# Altium footprint library standard.PcbLib: 330 footprints (part 19 of 21)
Each footprint in its own frame and in the unit in brackets; x right, y up, seen from the top. Pads: shape width x height; smd on the part's side, far side on the other; paste and mask are expansions set on the pad; w line width, h text height; cw(c..) or ccw(c..) is an arc to the next point about the centre after c.
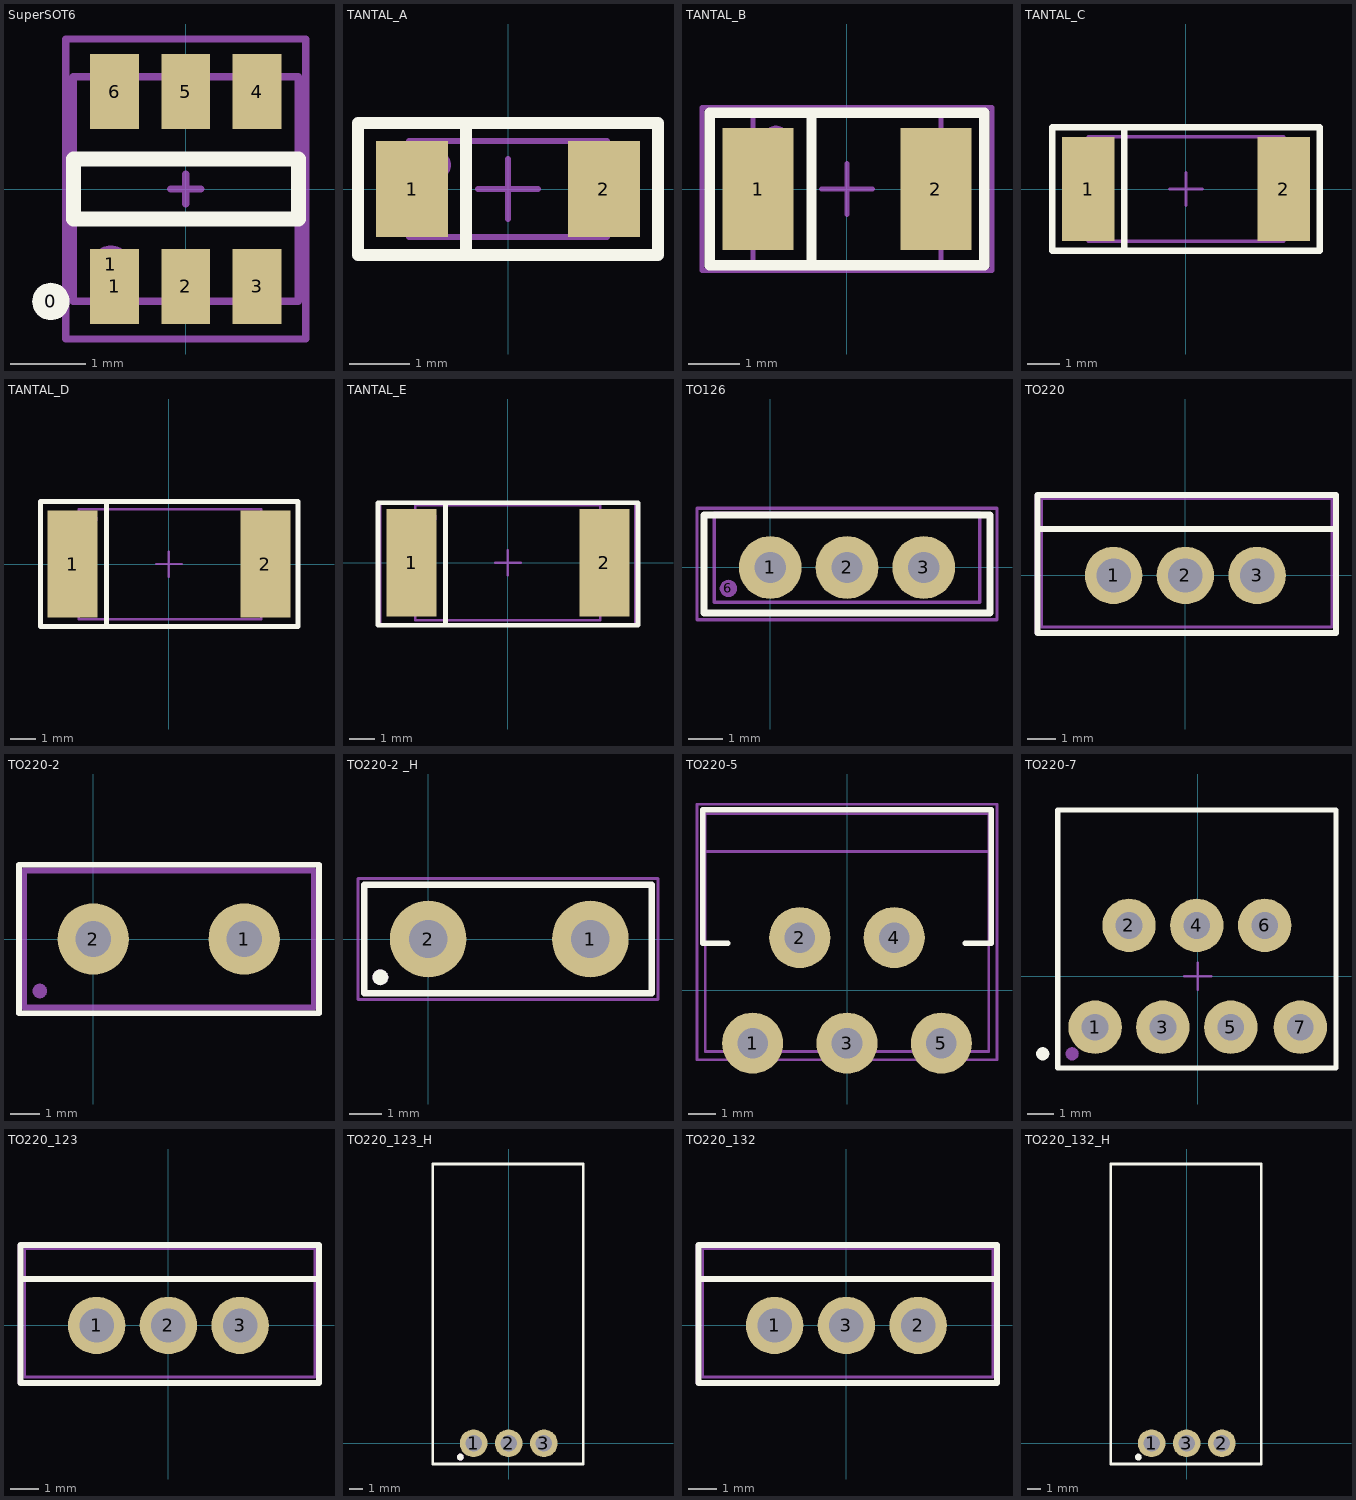
[diagram p18: the footprints below, top view; thin cyan lines are the x and y axes]

## SuperSOT6 [mm]
pads (8):
  round 0.5 on Top Overlay: 0(-1.8,-1.5)
  round 0.5 on Mech1: 1(-1,-1)
  rect 0.65x1 smd: 1(-0.95,-1.3) 2(0,-1.3) 3(0.95,-1.3) 4(0.95,1.3) 5(0,1.3) 6(-0.95,1.3)
Top Overlay:
  lines w0.2: -1.5,-0.4 1.5,-0.4 1.5,0.4 -1.5,0.4 -1.5,-0.4
Mechanical 1:
  lines w0.1: -1.5,-1.5 -1.5,1.5 1.5,1.5 1.5,-1.5 -1.5,-1.5
Mechanical 15:
  lines w0.1: -0.2,0 0.2,0 ; 0,-0.2 0,0.2 ; -1.6,-2 1.6,-2 1.6,2 1.5,2 -1.6,2 -1.6,-2
3D body "User Library-SSOT-6.STEP": height 1.05, standoff 0, extent -1.5,-1.5 1.5,1.5

## TANTAL_A [mm]
height 1.6
pads (3):
  rect 1.2x1.6 smd: 1(-1.6,0) 2(1.6,0)
  round 0.5 on Mech1: ""(-1.2,0.4)
Top Overlay:
  lines w0.2: -0.7,-1.1 -0.7,1.1 ; -2.5,-1.1 2.5,-1.1 2.5,1.1 -2.5,1.1 -2.5,-1.1
Mechanical 1:
  lines w0.1: -1.651,-0.8 1.651,-0.8 1.651,0.8 -1.651,0.8 -1.651,-0.8
Mechanical 15:
  lines w0.1: -0.5,0 0.5,0 ; 0,-0.5 0,0.5 ; -2.5,-1.1 -2.5,1.1 2.5,1.1 2.5,-1.1 -2.5,-1.1
3D body "User Library-AVX_ACASE.STEP": height 1.71, standoff 0, extent -1.7,-0.84 1.7,0.84

## TANTAL_B [mm]
height 1.9
pads (3):
  rect 1.4x2.4 smd: 1(-1.75,0) 2(1.75,0)
  round 0.5 on Mech1: ""(-1.4,1)
Top Overlay:
  lines w0.2: -0.7,-1.5 -0.7,1.5 ; -2.7,-1.5 2.7,-1.5 2.7,1.5 -2.7,1.5 -2.7,-1.5
Mechanical 1:
  lines w0.1: -1.85,-1.465 -1.85,1.465 1.85,1.465 1.85,-1.465 -1.85,-1.465
Mechanical 15:
  lines w0.1: -0.5,0 0.5,0 ; 0,-0.5 0,0.5 ; -2.85,-1.6 -2.85,1.6 2.85,1.6 2.85,-1.6 -2.85,-1.6
3D body "User Library-AVX_BCASE.STEP": height 2.03, standoff 0, extent -1.85,-1.465 1.85,1.465

## TANTAL_C [mm]
height 2.5
pads (3):
  rect 1.6x3.2 smd: 1(-3,0) 2(3,0)
  round 0.5 on Mech1: ""(-2.5,1.1)
Top Overlay:
  lines w0.2: -1.9,-1.9 -1.9,1.9 ; -4.1,-1.9 4.1,-1.9 4.1,1.9 -4.1,1.9 -4.1,-1.9
Mechanical 1:
  lines w0.1: -3,-1.6 -3,1.6 3,1.6 3,-1.6 -3,-1.6
Mechanical 15:
  lines w0.1: -0.5,0 0.5,0 ; 0,-0.5 0,0.5 ; -4.1,-1.9 -4.1,1.9 4.1,1.9 4.1,-1.9 -4.1,-1.9
3D body "User Library-AVX_C_CASE.STEP": height 2.7, standoff 0, extent -3.05,-1.675 3.05,1.675

## TANTAL_D [mm]
height 2.9
pads (3):
  rect 2x4.3 smd: 1(-3.85,0) 2(3.85,0)
  round 0.5 on Mech1: ""(-3.1,1.8)
Top Overlay:
  lines w0.2: -2.5,-2.5 -2.5,2.5 ; -5.15,-2.5 -5.15,2.5 5.15,2.5 5.15,-2.5 -5.15,-2.5
Mechanical 1:
  lines w0.1: -3.6,-2.2 3.7,-2.2 3.7,2.2 -3.6,2.2 -3.6,-2.2
Mechanical 15:
  lines w0.1: -0.5,0 0.5,0 ; 0,-0.5 0,0.5 ; -5.15,-2.5 5.15,-2.5 5.15,2.5 -5.15,2.5 -5.15,-2.5
3D body "User Library-AVX_D_CASE.STEP": height 3.01, standoff 0, extent -3.7,-2.225 3.7,2.225

## TANTAL_E [mm]
height 2.9
pads (3):
  rect 2x4.3 smd: 1(-3.85,0) 2(3.85,0)
  round 0.5 on Mech1: ""(-3.1,1.8)
Top Overlay:
  lines w0.2: -2.5,-2.5 -2.5,2.4 ; -5.2,-2.5 -5.2,2.4 5.2,2.4 5.2,-2.5 -5.2,-2.5
Mechanical 1:
  lines w0.1: -3.7,-2.3 3.7,-2.3 3.7,2.3 -3.7,2.3 -3.7,-2.3
Mechanical 15:
  lines w0.1: -0.5,0 0.5,0 ; 0,-0.5 0,0.5 ; -5.1,-2.5 5.1,-2.5 5.1,2.4 -5.1,2.4 -5.1,-2.5
3D body "User Library-AVX_E_CASE.STEP": height 4.2, standoff 0, extent -3.7,-2.225 3.7,2.225

## TO126 [mm]
pads (4):
  round 1.8 hole 0.9: 1(0,0) 2(2.2,0) 3(4.4,0)
  round 0.5 on Mech1: 6(-1.2,-0.6)
Top Overlay:
  lines w0.2: -1.9,-1.3 6.3,-1.3 6.3,1.5 -1.9,1.5 -1.9,-1.3
Mechanical 1:
  lines w0.1: -1.6,-1 -1.6,1.55 6,1.55 6,-1 -1.6,-1
Mechanical 15:
  lines w0.1: -2.1,-1.5 6.5,-1.5 6.5,1.7 -2.1,1.7 -2.1,-1.5
3D body "User Library-TO-126 (SOT32) Gold PCB.STEP": height 13.19, standoff -3.54, extent -1.6,-1 6,1.55

## TO220 [mm] "Generic TO-220 case, stay variant"
height 22
pads (3):
  round 2 hole 1.2: 1(-2.5,0) 2(0,0) 3(2.5,0)
Top Overlay:
  lines w0.2: -5.15,1.619 5.247,1.619 ; -5.15,-2 5.247,-2 5.247,2.8 -5.15,2.8 -5.15,-2
Mechanical 1:
  lines w0.1: -5,1.6 5.1,1.6 ; -5,-1.8 -5,2.675 5.1,2.675 5.1,-1.8 -5,-1.8
Mechanical 15:
  lines w0.1: -0.5,0 0.5,0 ; 0,-0.5 0,0.5 ; -5.2,-2 5.247,-2 5.247,2.8 -5.2,2.8 -5.2,-2
3D body "User Library-TO-220-4.STEP": height 22.06, standoff -6.74, extent -5,-1.8 5.2,2.7

## TO220-2 [mm]
pads (3):
  round 2.4 hole 1.2: 1(5.08,0) 2(0,0)
  round 0.5 on Mech1: ""(-1.8,-1.75)
Top Overlay:
  lines w0.2: -2.5,-2.5 7.6,-2.5 7.6,2.5 -2.5,2.5 -2.5,-2.5
Mechanical 1:
  lines w0.1: -2.276,-2.25 7.376,-2.25 7.376,2.25 -2.276,2.25 -2.276,-2.25
Mechanical 15:
  lines w0.1: -2.35,-2.35 7.45,-2.35 7.45,2.35 -2.35,2.35 -2.35,-2.35
3D body "User Library-TO 220-2.STEP": height 20.3, standoff -8.08, extent -2.276,-2.25 7.376,2.25

## TO220-2 _H [mm]
pads (4):
  round 2.4 hole 1.2: 1(5.08,0) 2(0,0)
  round 0.5 on Mech1: ""(-1.5,-1.2)
  round 0.5 on Top Overlay: ""(-1.5,-1.2)
Top Overlay:
  lines w0.2: -2,-1.7 -2,1.7 7,1.7 7,-1.7 -2,-1.7
Mechanical 1:
  lines w0.1: -2,-1.7 -2,1.7 7,1.7 7,-1.7 -2,-1.7
Mechanical 15:
  lines w0.1: -2.2,-1.9 -2.2,1.9 7.2,1.9 7.2,-1.9 -2.2,-1.9
3D body "User Library-TO220-2_OR-INV.STEP": height 0.72, standoff -7.5, extent -2.45,-0.4 7.55,20.2

## TO220-5 [mm] "5-Lead Plastic TO-220"
height 20
pads (5):
  round 2.2 hole 1.1: 1(-3.4,-1.9) 2(-1.7,1.9) 3(0,-1.9) 4(1.7,1.9) 5(3.4,-1.9)
Top Overlay:
  lines w0.2: -4.3,1.7 -5.2,1.7 -5.2,6.5 5.2,6.5 5.2,1.7 4.25,1.7
Mechanical 1:
  lines w0.1: -5.1,5 5.1,5 ; -5.1,-2.2 -5.1,6.356 5.1,6.356 5.1,-2.2 -5.1,-2.2
Mechanical 15:
  lines w0.1: -5.4,-2.5 -5.4,6.7 5.4,6.7 5.4,-2.5 -5.4,-2.5
3D body "TO220-5.step": height 19, standoff -9.28, extent -5.1,-2.2 5.1,6.356

## TO220-7 [mm]
height 20
pads (9):
  round 2 hole 1: 1(-3.84,-1.905) 2(-2.57,1.905) 3(-1.3,-1.905) 4(-0.03,1.905) 5(1.24,-1.905) 6(2.51,1.905) 7(3.84,-1.905)
  round 0.5 on Top Overlay: ""(-5.8,-2.9)
  round 0.5 on Mech1: ""(-4.7,-2.9)
Top Overlay:
  lines w0.2: -5.237,-3.429 5.177,-3.429 5.177,6.223 -5.237,6.223 -5.237,-3.429
Mechanical 1:
  lines w0.1: -5.237,-3.429 5.177,-3.429 5.177,6.223 -5.237,6.223 -5.237,-3.429
Mechanical 15:
  lines w0.05: -5.237,-3.429 -5.237,6.223 5.177,6.223 5.177,-3.429 -5.237,-3.429
  lines w0.1: -0.5,0 0.5,0 ; 0,-0.5 0,0.5
3D body "R-PZFM-T7.STEP": height 21, standoff -3.35, extent -5.04,-2.205 4.96,6.045

## TO220_123 [mm] "Generic TO-220 case, stay variant"
height 22
pads (3):
  round 2 hole 1.2: 1(-2.5,0) 2(0,0) 3(2.5,0)
Top Overlay:
  lines w0.2: -5.15,1.619 5.247,1.619 ; -5.15,-2 5.247,-2 5.247,2.8 -5.15,2.8 -5.15,-2
Mechanical 1:
  lines w0.1: -5,1.6 5.1,1.6 ; -5,-1.8 -5,2.675 5.1,2.675 5.1,-1.8 -5,-1.8
Mechanical 15:
  lines w0.1: -0.5,0 0.5,0 ; 0,-0.5 0,0.5 ; -5.2,-2 5.247,-2 5.247,2.8 -5.2,2.8 -5.2,-2
3D body "User Library-TO-220-4.STEP": height 22.06, standoff -6.74, extent -5,-1.8 5.2,2.7

## TO220_123_H [mm] "Generic TO-220 case, stay variant"
height 22
pads (5):
  round 2 hole 1.2: 1(-2.54,0) 2(0,0) 3(2.54,0)
  round 0.5 on Mech1: ""(-3.5,-1)
  round 0.5 on Top Overlay: ""(-3.5,-1)
Top Overlay:
  lines w0.2: -5.5,-1.5 5.4,-1.5 5.4,20.2 -5.5,20.2 -5.5,-1.5
Mechanical 15:
  lines w0.1: -0.5,0 0.5,0 ; 0,-0.5 0,0.5
3D body "TO220 L.step": height 4.5, standoff -3, extent -5,-0.452 5,19.252

## TO220_132 [mm] "Generic TO-220 case, stay variant"
height 22
pads (3):
  round 2 hole 1.2: 1(-2.5,0) 2(2.5,0) 3(0,0)
Top Overlay:
  lines w0.2: -5.15,1.619 5.247,1.619 ; -5.15,-2 5.247,-2 5.247,2.8 -5.15,2.8 -5.15,-2
Mechanical 1:
  lines w0.1: -5,1.6 5.1,1.6 ; -5,-1.8 -5,2.675 5.1,2.675 5.1,-1.8 -5,-1.8
Mechanical 15:
  lines w0.1: -0.5,0 0.5,0 ; 0,-0.5 0,0.5 ; -5.2,-2 5.247,-2 5.247,2.8 -5.2,2.8 -5.2,-2
3D body "User Library-TO-220-4.STEP": height 22.06, standoff -6.74, extent -5,-1.8 5.2,2.7

## TO220_132_H [mm] "Generic TO-220 case, stay variant"
height 22
pads (4):
  round 2 hole 1.2: 1(-2.54,0) 2(2.54,0) 3(0,0)
  round 0.5 on Top Overlay: ""(-3.5,-1)
Top Overlay:
  lines w0.2: -5.5,-1.5 -5.5,20.2 5.4,20.2 5.4,-1.5 -5.5,-1.5
Mechanical 15:
  lines w0.1: -0.5,0 0.5,0 ; 0,-0.5 0,0.5
3D body "to220.STEP": height 4.57, standoff -5.52, extent -5.1,-0.295 5.15,19.895